# Altium integrated library esd_library.IntLib: 970 symbols (part 3 of 6)
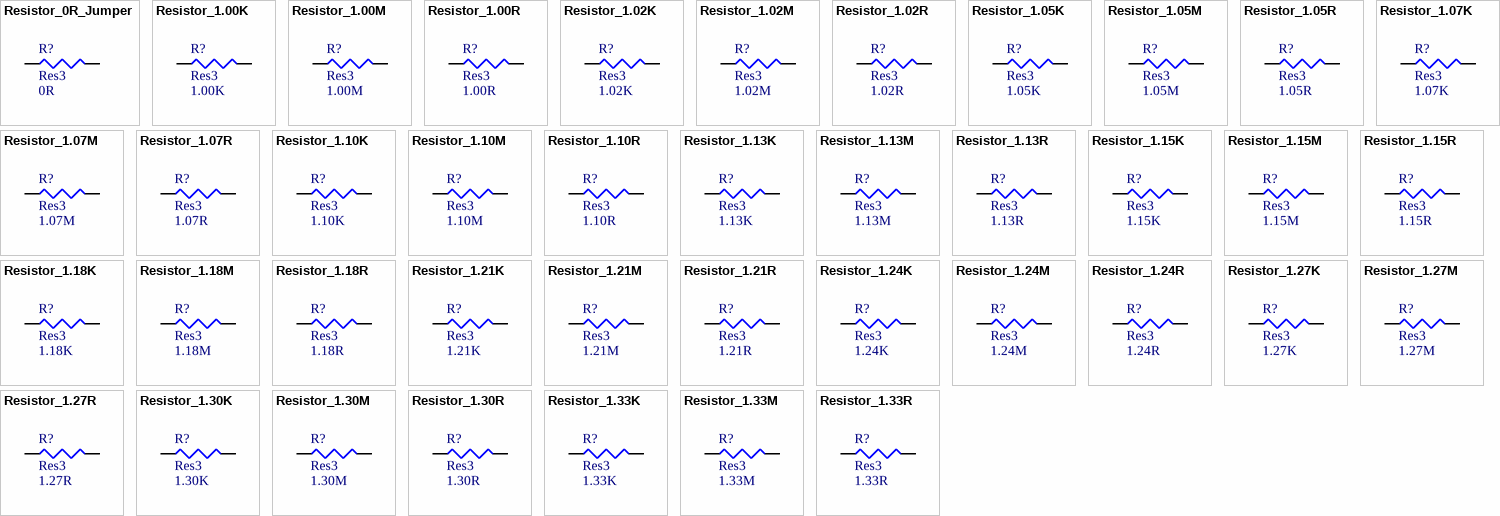
[diagram p28: symbols Resistor_0R_Jumper to Resistor_1.33R]

## Resistor_1.30K
designator R?, comment Res3  value 1.30K
RES SMD 1.30K OHM 1% 1/8W 0805; MPN: CRCW08051K30FKEA; Name: Resistor_1.30K; PN: 541-1.30KCCT-ND; URL: http://www.digikey.ca/product-detail/en/CRCW08051K30FKEA/541-1.30KCCT-ND
footprint RESC2112X05M (Chip Resistor, 2-Leads, Body 2.05x1.25mm, IPC Low Density)
pins: 1, 2

## Resistor_1.30M
designator R?, comment Res3  value 1.30M
RES SMD 1.30M OHM 1% 1/8W 0805; MPN: CRCW08051M30FKEA; Name: Resistor_1.30M; PN: 541-1.30MCCT-ND; URL: http://www.digikey.ca/product-detail/en/CRCW08051M30FKEA/541-1.30MCCT-ND
footprint RESC2112X05M (Chip Resistor, 2-Leads, Body 2.05x1.25mm, IPC Low Density)
pins: 1, 2

## Resistor_1.30R
designator R?, comment Res3  value 1.30R
RES SMD 1.30R OHM 1% 1/8W 0805; MPN: CRCW08051R30FKEA; Name: Resistor_1.30R; PN: 541-1.30CCCT-ND; URL: http://www.digikey.ca/product-detail/en/CRCW08051R30FKEA/541-1.30CCCT-ND
footprint RESC2112X05M (Chip Resistor, 2-Leads, Body 2.05x1.25mm, IPC Low Density)
pins: 1, 2

## Resistor_1.33K
designator R?, comment Res3  value 1.33K
RES SMD 1.33K OHM 1% 1/8W 0805; MPN: CRCW08051K33FKEA; Name: Resistor_1.33K; PN: 541-1.33KCCT-ND; URL: http://www.digikey.ca/product-detail/en/CRCW08051K33FKEA/541-1.33KCCT-ND
footprint RESC2112X05M (Chip Resistor, 2-Leads, Body 2.05x1.25mm, IPC Low Density)
pins: 1, 2

## Resistor_1.33M
designator R?, comment Res3  value 1.33M
RES SMD 1.33M OHM 1% 1/8W 0805; MPN: CRCW08051M33FKEA; Name: Resistor_1.33M; PN: 541-1.33MCCT-ND; URL: http://www.digikey.ca/product-detail/en/CRCW08051M33FKEA/541-1.33MCCT-ND
footprint RESC2112X05M (Chip Resistor, 2-Leads, Body 2.05x1.25mm, IPC Low Density)
pins: 1, 2

## Resistor_1.33R
designator R?, comment Res3  value 1.33R
RES SMD 1.33R OHM 1% 1/8W 0805; MPN: CRCW08051R33FKEA; Name: Resistor_1.33R; PN: 541-1.33CCCT-ND; URL: http://www.digikey.ca/product-detail/en/CRCW08051R33FKEA/541-1.33CCCT-ND
footprint RESC2112X05M (Chip Resistor, 2-Leads, Body 2.05x1.25mm, IPC Low Density)
pins: 1, 2

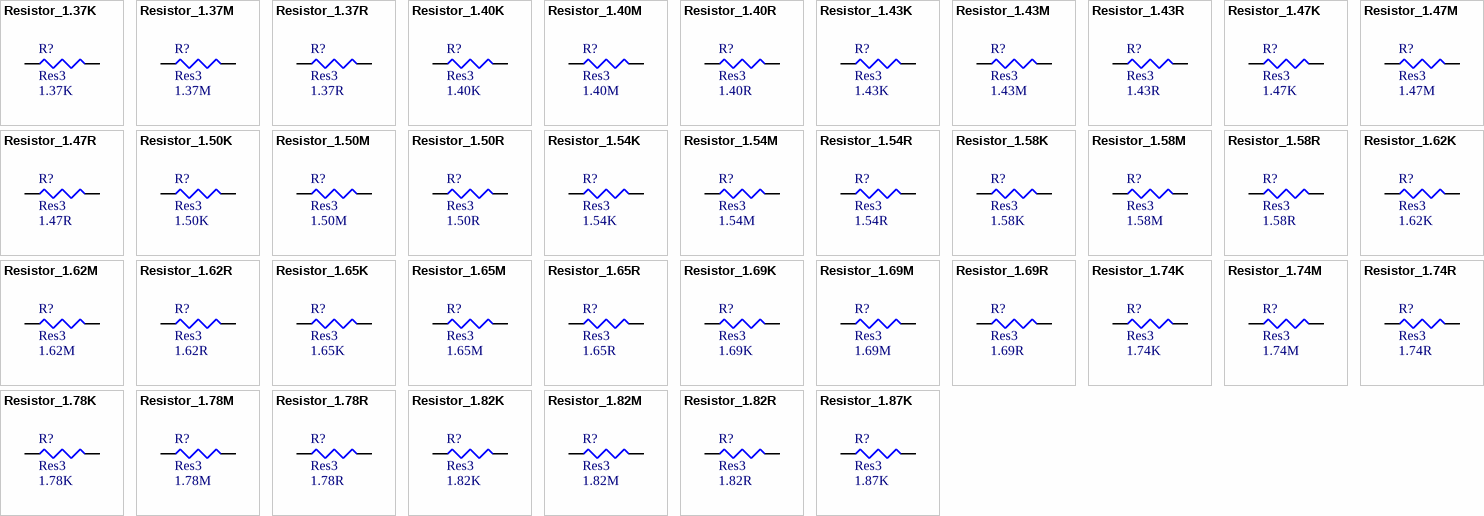
[diagram p11: symbols Resistor_1.37K to Resistor_1.87K]

## Resistor_1.37K
designator R?, comment Res3  value 1.37K
RES SMD 1.37K OHM 1% 1/8W 0805; MPN: CRCW08051K37FKEA; Name: Resistor_1.37K; PN: 541-1.37KCCT-ND; URL: http://www.digikey.ca/product-detail/en/CRCW08051K37FKEA/541-1.37KCCT-ND
footprint RESC2112X05M (Chip Resistor, 2-Leads, Body 2.05x1.25mm, IPC Low Density)
pins: 1, 2

## Resistor_1.37M
designator R?, comment Res3  value 1.37M
RES SMD 1.37M OHM 1% 1/8W 0805; MPN: CRCW08051M37FKEA; Name: Resistor_1.37M; PN: 541-1.37MCCT-ND; URL: http://www.digikey.ca/product-detail/en/CRCW08051M37FKEA/541-1.37MCCT-ND
footprint RESC2112X05M (Chip Resistor, 2-Leads, Body 2.05x1.25mm, IPC Low Density)
pins: 1, 2

## Resistor_1.37R
designator R?, comment Res3  value 1.37R
RES SMD 1.37R OHM 1% 1/8W 0805; MPN: CRCW08051R37FKEA; Name: Resistor_1.37R; PN: 541-1.37CCCT-ND; URL: http://www.digikey.ca/product-detail/en/CRCW08051R37FKEA/541-1.37CCCT-ND
footprint RESC2112X05M (Chip Resistor, 2-Leads, Body 2.05x1.25mm, IPC Low Density)
pins: 1, 2

## Resistor_1.40K
designator R?, comment Res3  value 1.40K
RES SMD 1.40K OHM 1% 1/8W 0805; MPN: CRCW08051K40FKEA; Name: Resistor_1.40K; PN: 541-1.40KCCT-ND; URL: http://www.digikey.ca/product-detail/en/CRCW08051K40FKEA/541-1.40KCCT-ND
footprint RESC2112X05M (Chip Resistor, 2-Leads, Body 2.05x1.25mm, IPC Low Density)
pins: 1, 2

## Resistor_1.40M
designator R?, comment Res3  value 1.40M
RES SMD 1.40M OHM 1% 1/8W 0805; MPN: CRCW08051M40FKEA; Name: Resistor_1.40M; PN: 541-1.40MCCT-ND; URL: http://www.digikey.ca/product-detail/en/CRCW08051M40FKEA/541-1.40MCCT-ND
footprint RESC2112X05M (Chip Resistor, 2-Leads, Body 2.05x1.25mm, IPC Low Density)
pins: 1, 2

## Resistor_1.40R
designator R?, comment Res3  value 1.40R
RES SMD 1.40R OHM 1% 1/8W 0805; MPN: CRCW08051R40FKEA; Name: Resistor_1.40R; PN: 541-1.40CCCT-ND; URL: http://www.digikey.ca/product-detail/en/CRCW08051R40FKEA/541-1.40CCCT-ND
footprint RESC2112X05M (Chip Resistor, 2-Leads, Body 2.05x1.25mm, IPC Low Density)
pins: 1, 2

## Resistor_1.43K
designator R?, comment Res3  value 1.43K
RES SMD 1.43K OHM 1% 1/8W 0805; MPN: CRCW08051K43FKEA; Name: Resistor_1.43K; PN: 541-1.43KCCT-ND; URL: http://www.digikey.ca/product-detail/en/CRCW08051K43FKEA/541-1.43KCCT-ND
footprint RESC2112X05M (Chip Resistor, 2-Leads, Body 2.05x1.25mm, IPC Low Density)
pins: 1, 2

## Resistor_1.43M
designator R?, comment Res3  value 1.43M
RES SMD 1.43M OHM 1% 1/8W 0805; MPN: CRCW08051M43FKEA; Name: Resistor_1.43M; PN: 541-1.43MCCT-ND; URL: http://www.digikey.ca/product-detail/en/CRCW08051M43FKEA/541-1.43MCCT-ND
footprint RESC2112X05M (Chip Resistor, 2-Leads, Body 2.05x1.25mm, IPC Low Density)
pins: 1, 2

## Resistor_1.43R
designator R?, comment Res3  value 1.43R
RES SMD 1.43R OHM 1% 1/8W 0805; MPN: CRCW08051R43FKEA; Name: Resistor_1.43R; PN: 541-1.43CCCT-ND; URL: http://www.digikey.ca/product-detail/en/CRCW08051R43FKEA/541-1.43CCCT-ND
footprint RESC2112X05M (Chip Resistor, 2-Leads, Body 2.05x1.25mm, IPC Low Density)
pins: 1, 2

## Resistor_1.47K
designator R?, comment Res3  value 1.47K
RES SMD 1.47K OHM 1% 1/8W 0805; MPN: CRCW08051K47FKEA; Name: Resistor_1.47K; PN: 541-1.47KCCT-ND; URL: http://www.digikey.ca/product-detail/en/CRCW08051K47FKEA/541-1.47KCCT-ND
footprint RESC2112X05M (Chip Resistor, 2-Leads, Body 2.05x1.25mm, IPC Low Density)
pins: 1, 2

## Resistor_1.47M
designator R?, comment Res3  value 1.47M
RES SMD 1.47M OHM 1% 1/8W 0805; MPN: CRCW08051M47FKEA; Name: Resistor_1.47M; PN: 541-1.47MCCT-ND; URL: http://www.digikey.ca/product-detail/en/CRCW08051M47FKEA/541-1.47MCCT-ND
footprint RESC2112X05M (Chip Resistor, 2-Leads, Body 2.05x1.25mm, IPC Low Density)
pins: 1, 2

## Resistor_1.47R
designator R?, comment Res3  value 1.47R
RES SMD 1.47R OHM 1% 1/8W 0805; MPN: CRCW08051R47FKEA; Name: Resistor_1.47R; PN: 541-1.47CCCT-ND; URL: http://www.digikey.ca/product-detail/en/CRCW08051R47FKEA/541-1.47CCCT-ND
footprint RESC2112X05M (Chip Resistor, 2-Leads, Body 2.05x1.25mm, IPC Low Density)
pins: 1, 2

## Resistor_1.50K
designator R?, comment Res3  value 1.50K
RES SMD 1.50K OHM 1% 1/8W 0805; MPN: CRCW08051K50FKEA; Name: Resistor_1.50K; PN: 541-1.50KCCT-ND; URL: http://www.digikey.ca/product-detail/en/CRCW08051K50FKEA/541-1.50KCCT-ND
footprint RESC2112X05M (Chip Resistor, 2-Leads, Body 2.05x1.25mm, IPC Low Density)
pins: 1, 2

## Resistor_1.50M
designator R?, comment Res3  value 1.50M
RES SMD 1.50M OHM 1% 1/8W 0805; MPN: CRCW08051M50FKEA; Name: Resistor_1.50M; PN: 541-1.50MCCT-ND; URL: http://www.digikey.ca/product-detail/en/CRCW08051M50FKEA/541-1.50MCCT-ND
footprint RESC2112X05M (Chip Resistor, 2-Leads, Body 2.05x1.25mm, IPC Low Density)
pins: 1, 2

## Resistor_1.50R
designator R?, comment Res3  value 1.50R
RES SMD 1.50R OHM 1% 1/8W 0805; MPN: CRCW08051R50FKEA; Name: Resistor_1.50R; PN: 541-1.50CCCT-ND; URL: http://www.digikey.ca/product-detail/en/CRCW08051R50FKEA/541-1.50CCCT-ND
footprint RESC2112X05M (Chip Resistor, 2-Leads, Body 2.05x1.25mm, IPC Low Density)
pins: 1, 2

## Resistor_1.54K
designator R?, comment Res3  value 1.54K
RES SMD 1.54K OHM 1% 1/8W 0805; MPN: CRCW08051K54FKEA; Name: Resistor_1.54K; PN: 541-1.54KCCT-ND; URL: http://www.digikey.ca/product-detail/en/CRCW08051K54FKEA/541-1.54KCCT-ND
footprint RESC2112X05M (Chip Resistor, 2-Leads, Body 2.05x1.25mm, IPC Low Density)
pins: 1, 2

## Resistor_1.54M
designator R?, comment Res3  value 1.54M
RES SMD 1.54M OHM 1% 1/8W 0805; MPN: CRCW08051M54FKEA; Name: Resistor_1.54M; PN: 541-1.54MCCT-ND; URL: http://www.digikey.ca/product-detail/en/CRCW08051M54FKEA/541-1.54MCCT-ND
footprint RESC2112X05M (Chip Resistor, 2-Leads, Body 2.05x1.25mm, IPC Low Density)
pins: 1, 2

## Resistor_1.54R
designator R?, comment Res3  value 1.54R
RES SMD 1.54R OHM 1% 1/8W 0805; MPN: CRCW08051R54FKEA; Name: Resistor_1.54R; PN: 541-1.54CCCT-ND; URL: http://www.digikey.ca/product-detail/en/CRCW08051R54FKEA/541-1.54CCCT-ND
footprint RESC2112X05M (Chip Resistor, 2-Leads, Body 2.05x1.25mm, IPC Low Density)
pins: 1, 2

## Resistor_1.58K
designator R?, comment Res3  value 1.58K
RES SMD 1.58K OHM 1% 1/8W 0805; MPN: CRCW08051K58FKEA; Name: Resistor_1.58K; PN: 541-1.58KCCT-ND; URL: http://www.digikey.ca/product-detail/en/CRCW08051K58FKEA/541-1.58KCCT-ND
footprint RESC2112X05M (Chip Resistor, 2-Leads, Body 2.05x1.25mm, IPC Low Density)
pins: 1, 2

## Resistor_1.58M
designator R?, comment Res3  value 1.58M
RES SMD 1.58M OHM 1% 1/8W 0805; MPN: CRCW08051M58FKEA; Name: Resistor_1.58M; PN: 541-1.58MCCT-ND; URL: http://www.digikey.ca/product-detail/en/CRCW08051M58FKEA/541-1.58MCCT-ND
footprint RESC2112X05M (Chip Resistor, 2-Leads, Body 2.05x1.25mm, IPC Low Density)
pins: 1, 2

## Resistor_1.58R
designator R?, comment Res3  value 1.58R
RES SMD 1.58R OHM 1% 1/8W 0805; MPN: CRCW08051R58FKEA; Name: Resistor_1.58R; PN: 541-1.58CCCT-ND; URL: http://www.digikey.ca/product-detail/en/CRCW08051R58FKEA/541-1.58CCCT-ND
footprint RESC2112X05M (Chip Resistor, 2-Leads, Body 2.05x1.25mm, IPC Low Density)
pins: 1, 2

## Resistor_1.62K
designator R?, comment Res3  value 1.62K
RES SMD 1.62K OHM 1% 1/8W 0805; MPN: CRCW08051K62FKEA; Name: Resistor_1.62K; PN: 541-1.62KCCT-ND; URL: http://www.digikey.ca/product-detail/en/CRCW08051K62FKEA/541-1.62KCCT-ND
footprint RESC2112X05M (Chip Resistor, 2-Leads, Body 2.05x1.25mm, IPC Low Density)
pins: 1, 2

## Resistor_1.62M
designator R?, comment Res3  value 1.62M
RES SMD 1.62M OHM 1% 1/8W 0805; MPN: CRCW08051M62FKEA; Name: Resistor_1.62M; PN: 541-1.62MCCT-ND; URL: http://www.digikey.ca/product-detail/en/CRCW08051M62FKEA/541-1.62MCCT-ND
footprint RESC2112X05M (Chip Resistor, 2-Leads, Body 2.05x1.25mm, IPC Low Density)
pins: 1, 2

## Resistor_1.62R
designator R?, comment Res3  value 1.62R
RES SMD 1.62R OHM 1% 1/8W 0805; MPN: CRCW08051R62FKEA; Name: Resistor_1.62R; PN: 541-1.62CCCT-ND; URL: http://www.digikey.ca/product-detail/en/CRCW08051R62FKEA/541-1.62CCCT-ND
footprint RESC2112X05M (Chip Resistor, 2-Leads, Body 2.05x1.25mm, IPC Low Density)
pins: 1, 2

## Resistor_1.65K
designator R?, comment Res3  value 1.65K
RES SMD 1.65K OHM 1% 1/8W 0805; MPN: CRCW08051K65FKEA; Name: Resistor_1.65K; PN: 541-1.65KCCT-ND; URL: http://www.digikey.ca/product-detail/en/CRCW08051K65FKEA/541-1.65KCCT-ND
footprint RESC2112X05M (Chip Resistor, 2-Leads, Body 2.05x1.25mm, IPC Low Density)
pins: 1, 2

## Resistor_1.65M
designator R?, comment Res3  value 1.65M
RES SMD 1.65M OHM 1% 1/8W 0805; MPN: CRCW08051M65FKEA; Name: Resistor_1.65M; PN: 541-1.65MCCT-ND; URL: http://www.digikey.ca/product-detail/en/CRCW08051M65FKEA/541-1.65MCCT-ND
footprint RESC2112X05M (Chip Resistor, 2-Leads, Body 2.05x1.25mm, IPC Low Density)
pins: 1, 2

## Resistor_1.65R
designator R?, comment Res3  value 1.65R
RES SMD 1.65R OHM 1% 1/8W 0805; MPN: CRCW08051R65FKEA; Name: Resistor_1.65R; PN: 541-1.65CCCT-ND; URL: http://www.digikey.ca/product-detail/en/CRCW08051R65FKEA/541-1.65CCCT-ND
footprint RESC2112X05M (Chip Resistor, 2-Leads, Body 2.05x1.25mm, IPC Low Density)
pins: 1, 2

## Resistor_1.69K
designator R?, comment Res3  value 1.69K
RES SMD 1.69K OHM 1% 1/8W 0805; MPN: CRCW08051K69FKEA; Name: Resistor_1.69K; PN: 541-1.69KCCT-ND; URL: http://www.digikey.ca/product-detail/en/CRCW08051K69FKEA/541-1.69KCCT-ND
footprint RESC2112X05M (Chip Resistor, 2-Leads, Body 2.05x1.25mm, IPC Low Density)
pins: 1, 2

## Resistor_1.69M
designator R?, comment Res3  value 1.69M
RES SMD 1.69M OHM 1% 1/8W 0805; MPN: CRCW08051M69FKEA; Name: Resistor_1.69M; PN: 541-1.69MCCT-ND; URL: http://www.digikey.ca/product-detail/en/CRCW08051M69FKEA/541-1.69MCCT-ND
footprint RESC2112X05M (Chip Resistor, 2-Leads, Body 2.05x1.25mm, IPC Low Density)
pins: 1, 2

## Resistor_1.69R
designator R?, comment Res3  value 1.69R
RES SMD 1.69R OHM 1% 1/8W 0805; MPN: CRCW08051R69FKEA; Name: Resistor_1.69R; PN: 541-1.69CCCT-ND; URL: http://www.digikey.ca/product-detail/en/CRCW08051R69FKEA/541-1.69CCCT-ND
footprint RESC2112X05M (Chip Resistor, 2-Leads, Body 2.05x1.25mm, IPC Low Density)
pins: 1, 2

## Resistor_1.74K
designator R?, comment Res3  value 1.74K
RES SMD 1.74K OHM 1% 1/8W 0805; MPN: CRCW08051K74FKEA; Name: Resistor_1.74K; PN: 541-1.74KCCT-ND; URL: http://www.digikey.ca/product-detail/en/CRCW08051K74FKEA/541-1.74KCCT-ND
footprint RESC2112X05M (Chip Resistor, 2-Leads, Body 2.05x1.25mm, IPC Low Density)
pins: 1, 2

## Resistor_1.74M
designator R?, comment Res3  value 1.74M
RES SMD 1.74M OHM 1% 1/8W 0805; MPN: CRCW08051M74FKEA; Name: Resistor_1.74M; PN: 541-1.74MCCT-ND; URL: http://www.digikey.ca/product-detail/en/CRCW08051M74FKEA/541-1.74MCCT-ND
footprint RESC2112X05M (Chip Resistor, 2-Leads, Body 2.05x1.25mm, IPC Low Density)
pins: 1, 2

## Resistor_1.74R
designator R?, comment Res3  value 1.74R
RES SMD 1.74R OHM 1% 1/8W 0805; MPN: CRCW08051R74FKEA; Name: Resistor_1.74R; PN: 541-1.74CCCT-ND; URL: http://www.digikey.ca/product-detail/en/CRCW08051R74FKEA/541-1.74CCCT-ND
footprint RESC2112X05M (Chip Resistor, 2-Leads, Body 2.05x1.25mm, IPC Low Density)
pins: 1, 2

## Resistor_1.78K
designator R?, comment Res3  value 1.78K
RES SMD 1.78K OHM 1% 1/8W 0805; MPN: CRCW08051K78FKEA; Name: Resistor_1.78K; PN: 541-1.78KCCT-ND; URL: http://www.digikey.ca/product-detail/en/CRCW08051K78FKEA/541-1.78KCCT-ND
footprint RESC2112X05M (Chip Resistor, 2-Leads, Body 2.05x1.25mm, IPC Low Density)
pins: 1, 2

## Resistor_1.78M
designator R?, comment Res3  value 1.78M
RES SMD 1.78M OHM 1% 1/8W 0805; MPN: CRCW08051M78FKEA; Name: Resistor_1.78M; PN: 541-1.78MCCT-ND; URL: http://www.digikey.ca/product-detail/en/CRCW08051M78FKEA/541-1.78MCCT-ND
footprint RESC2112X05M (Chip Resistor, 2-Leads, Body 2.05x1.25mm, IPC Low Density)
pins: 1, 2

## Resistor_1.78R
designator R?, comment Res3  value 1.78R
RES SMD 1.78R OHM 1% 1/8W 0805; MPN: CRCW08051R78FKEA; Name: Resistor_1.78R; PN: 541-1.78CCCT-ND; URL: http://www.digikey.ca/product-detail/en/CRCW08051R78FKEA/541-1.78CCCT-ND
footprint RESC2112X05M (Chip Resistor, 2-Leads, Body 2.05x1.25mm, IPC Low Density)
pins: 1, 2

## Resistor_1.82K
designator R?, comment Res3  value 1.82K
RES SMD 1.82K OHM 1% 1/8W 0805; MPN: CRCW08051K82FKEA; Name: Resistor_1.82K; PN: 541-1.82KCCT-ND; URL: http://www.digikey.ca/product-detail/en/CRCW08051K82FKEA/541-1.82KCCT-ND
footprint RESC2112X05M (Chip Resistor, 2-Leads, Body 2.05x1.25mm, IPC Low Density)
pins: 1, 2

## Resistor_1.82M
designator R?, comment Res3  value 1.82M
RES SMD 1.82M OHM 1% 1/8W 0805; MPN: CRCW08051M82FKEA; Name: Resistor_1.82M; PN: 541-1.82MCCT-ND; URL: http://www.digikey.ca/product-detail/en/CRCW08051M82FKEA/541-1.82MCCT-ND
footprint RESC2112X05M (Chip Resistor, 2-Leads, Body 2.05x1.25mm, IPC Low Density)
pins: 1, 2

## Resistor_1.82R
designator R?, comment Res3  value 1.82R
RES SMD 1.82R OHM 1% 1/8W 0805; MPN: CRCW08051R82FKEA; Name: Resistor_1.82R; PN: 541-1.82CCCT-ND; URL: http://www.digikey.ca/product-detail/en/CRCW08051R82FKEA/541-1.82CCCT-ND
footprint RESC2112X05M (Chip Resistor, 2-Leads, Body 2.05x1.25mm, IPC Low Density)
pins: 1, 2

## Resistor_1.87K
designator R?, comment Res3  value 1.87K
RES SMD 1.87K OHM 1% 1/8W 0805; MPN: CRCW08051K87FKEA; Name: Resistor_1.87K; PN: 541-1.87KCCT-ND; URL: http://www.digikey.ca/product-detail/en/CRCW08051K87FKEA/541-1.87KCCT-ND
footprint RESC2112X05M (Chip Resistor, 2-Leads, Body 2.05x1.25mm, IPC Low Density)
pins: 1, 2

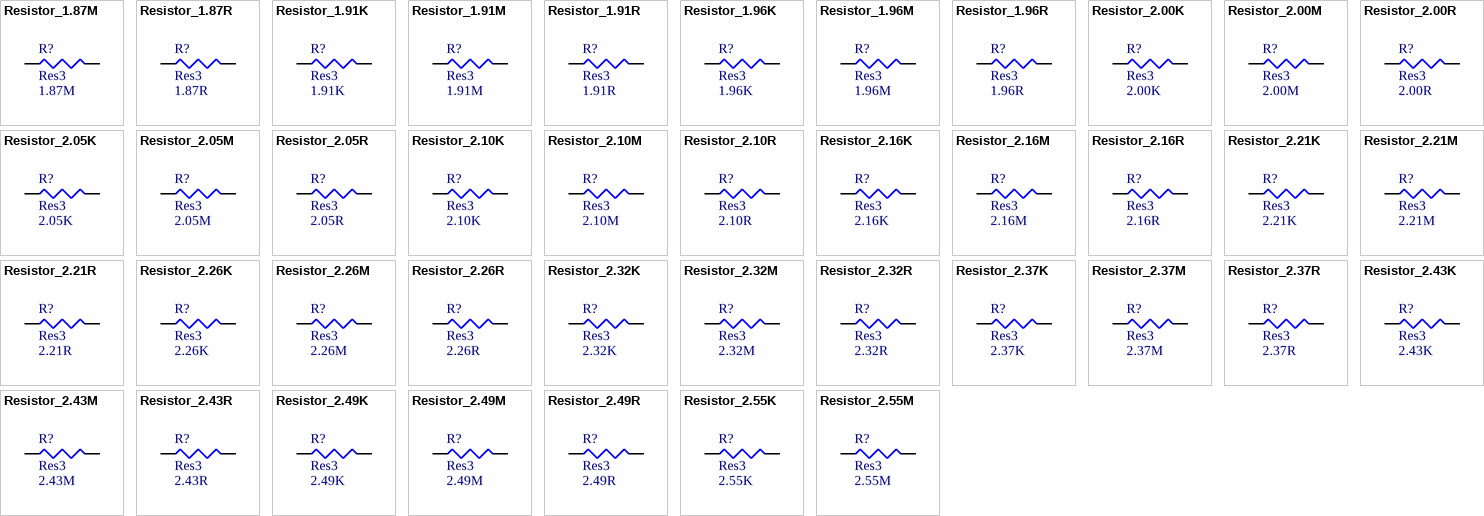
[diagram p12: symbols Resistor_1.87M to Resistor_2.55M]

## Resistor_1.87M
designator R?, comment Res3  value 1.87M
RES SMD 1.87M OHM 1% 1/8W 0805; MPN: CRCW08051M87FKEA; Name: Resistor_1.87M; PN: 541-1.87MCCT-ND; URL: http://www.digikey.ca/product-detail/en/CRCW08051M87FKEA/541-1.87MCCT-ND
footprint RESC2112X05M (Chip Resistor, 2-Leads, Body 2.05x1.25mm, IPC Low Density)
pins: 1, 2

## Resistor_1.87R
designator R?, comment Res3  value 1.87R
RES SMD 1.87R OHM 1% 1/8W 0805; MPN: CRCW08051R87FKEA; Name: Resistor_1.87R; PN: 541-1.87CCCT-ND; URL: http://www.digikey.ca/product-detail/en/CRCW08051R87FKEA/541-1.87CCCT-ND
footprint RESC2112X05M (Chip Resistor, 2-Leads, Body 2.05x1.25mm, IPC Low Density)
pins: 1, 2

## Resistor_1.91K
designator R?, comment Res3  value 1.91K
RES SMD 1.91K OHM 1% 1/8W 0805; MPN: CRCW08051K91FKEA; Name: Resistor_1.91K; PN: 541-1.91KCCT-ND; URL: http://www.digikey.ca/product-detail/en/CRCW08051K91FKEA/541-1.91KCCT-ND
footprint RESC2112X05M (Chip Resistor, 2-Leads, Body 2.05x1.25mm, IPC Low Density)
pins: 1, 2

## Resistor_1.91M
designator R?, comment Res3  value 1.91M
RES SMD 1.91M OHM 1% 1/8W 0805; MPN: CRCW08051M91FKEA; Name: Resistor_1.91M; PN: 541-1.91MCCT-ND; URL: http://www.digikey.ca/product-detail/en/CRCW08051M91FKEA/541-1.91MCCT-ND
footprint RESC2112X05M (Chip Resistor, 2-Leads, Body 2.05x1.25mm, IPC Low Density)
pins: 1, 2

## Resistor_1.91R
designator R?, comment Res3  value 1.91R
RES SMD 1.91R OHM 1% 1/8W 0805; MPN: CRCW08051R91FKEA; Name: Resistor_1.91R; PN: 541-1.91CCCT-ND; URL: http://www.digikey.ca/product-detail/en/CRCW08051R91FKEA/541-1.91CCCT-ND
footprint RESC2112X05M (Chip Resistor, 2-Leads, Body 2.05x1.25mm, IPC Low Density)
pins: 1, 2

## Resistor_1.96K
designator R?, comment Res3  value 1.96K
RES SMD 1.96K OHM 1% 1/8W 0805; MPN: CRCW08051K96FKEA; Name: Resistor_1.96K; PN: 541-1.96KCCT-ND; URL: http://www.digikey.ca/product-detail/en/CRCW08051K96FKEA/541-1.96KCCT-ND
footprint RESC2112X05M (Chip Resistor, 2-Leads, Body 2.05x1.25mm, IPC Low Density)
pins: 1, 2

## Resistor_1.96M
designator R?, comment Res3  value 1.96M
RES SMD 1.96M OHM 1% 1/8W 0805; MPN: CRCW08051M96FKEA; Name: Resistor_1.96M; PN: 541-1.96MCCT-ND; URL: http://www.digikey.ca/product-detail/en/CRCW08051M96FKEA/541-1.96MCCT-ND
footprint RESC2112X05M (Chip Resistor, 2-Leads, Body 2.05x1.25mm, IPC Low Density)
pins: 1, 2

## Resistor_1.96R
designator R?, comment Res3  value 1.96R
RES SMD 1.96R OHM 1% 1/8W 0805; MPN: CRCW08051R96FKEA; Name: Resistor_1.96R; PN: 541-1.96CCCT-ND; URL: http://www.digikey.ca/product-detail/en/CRCW08051R96FKEA/541-1.96CCCT-ND
footprint RESC2112X05M (Chip Resistor, 2-Leads, Body 2.05x1.25mm, IPC Low Density)
pins: 1, 2

## Resistor_2.00K
designator R?, comment Res3  value 2.00K
RES SMD 2.00K OHM 1% 1/8W 0805; MPN: CRCW08052K00FKEA; Name: Resistor_2.00K; PN: 541-2.00KCCT-ND; URL: http://www.digikey.ca/product-detail/en/CRCW08052K00FKEA/541-2.00KCCT-ND
footprint RESC2112X05M (Chip Resistor, 2-Leads, Body 2.05x1.25mm, IPC Low Density)
pins: 1, 2

## Resistor_2.00M
designator R?, comment Res3  value 2.00M
RES SMD 2.00M OHM 1% 1/8W 0805; MPN: CRCW08052M00FKEA; Name: Resistor_2.00M; PN: 541-2.00MCCT-ND; URL: http://www.digikey.ca/product-detail/en/CRCW08052M00FKEA/541-2.00MCCT-ND
footprint RESC2112X05M (Chip Resistor, 2-Leads, Body 2.05x1.25mm, IPC Low Density)
pins: 1, 2

## Resistor_2.00R
designator R?, comment Res3  value 2.00R
RES SMD 2.00R OHM 1% 1/8W 0805; MPN: CRCW08052R00FKEA; Name: Resistor_2.00R; PN: 541-2.00CCCT-ND; URL: http://www.digikey.ca/product-detail/en/CRCW08052R00FKEA/541-2.00CCCT-ND
footprint RESC2112X05M (Chip Resistor, 2-Leads, Body 2.05x1.25mm, IPC Low Density)
pins: 1, 2

## Resistor_2.05K
designator R?, comment Res3  value 2.05K
RES SMD 2.05K OHM 1% 1/8W 0805; MPN: CRCW08052K05FKEA; Name: Resistor_2.05K; PN: 541-2.05KCCT-ND; URL: http://www.digikey.ca/product-detail/en/CRCW08052K05FKEA/541-2.05KCCT-ND
footprint RESC2112X05M (Chip Resistor, 2-Leads, Body 2.05x1.25mm, IPC Low Density)
pins: 1, 2

## Resistor_2.05M
designator R?, comment Res3  value 2.05M
RES SMD 2.05M OHM 1% 1/8W 0805; MPN: CRCW08052M05FKEA; Name: Resistor_2.05M; PN: 541-2.05MCCT-ND; URL: http://www.digikey.ca/product-detail/en/CRCW08052M05FKEA/541-2.05MCCT-ND
footprint RESC2112X05M (Chip Resistor, 2-Leads, Body 2.05x1.25mm, IPC Low Density)
pins: 1, 2

## Resistor_2.05R
designator R?, comment Res3  value 2.05R
RES SMD 2.05R OHM 1% 1/8W 0805; MPN: CRCW08052R05FKEA; Name: Resistor_2.05R; PN: 541-2.05CCCT-ND; URL: http://www.digikey.ca/product-detail/en/CRCW08052R05FKEA/541-2.05CCCT-ND
footprint RESC2112X05M (Chip Resistor, 2-Leads, Body 2.05x1.25mm, IPC Low Density)
pins: 1, 2

## Resistor_2.10K
designator R?, comment Res3  value 2.10K
RES SMD 2.10K OHM 1% 1/8W 0805; MPN: CRCW08052K10FKEA; Name: Resistor_2.10K; PN: 541-2.10KCCT-ND; URL: http://www.digikey.ca/product-detail/en/CRCW08052K10FKEA/541-2.10KCCT-ND
footprint RESC2112X05M (Chip Resistor, 2-Leads, Body 2.05x1.25mm, IPC Low Density)
pins: 1, 2

## Resistor_2.10M
designator R?, comment Res3  value 2.10M
RES SMD 2.10M OHM 1% 1/8W 0805; MPN: CRCW08052M10FKEA; Name: Resistor_2.10M; PN: 541-2.10MCCT-ND; URL: http://www.digikey.ca/product-detail/en/CRCW08052M10FKEA/541-2.10MCCT-ND
footprint RESC2112X05M (Chip Resistor, 2-Leads, Body 2.05x1.25mm, IPC Low Density)
pins: 1, 2

## Resistor_2.10R
designator R?, comment Res3  value 2.10R
RES SMD 2.10R OHM 1% 1/8W 0805; MPN: CRCW08052R10FKEA; Name: Resistor_2.10R; PN: 541-2.10CCCT-ND; URL: http://www.digikey.ca/product-detail/en/CRCW08052R10FKEA/541-2.10CCCT-ND
footprint RESC2112X05M (Chip Resistor, 2-Leads, Body 2.05x1.25mm, IPC Low Density)
pins: 1, 2

## Resistor_2.16K
designator R?, comment Res3  value 2.16K
RES SMD 2.16K OHM 1% 1/8W 0805; MPN: CRCW08052K16FKEA; Name: Resistor_2.16K; PN: 541-2.16KCCT-ND; URL: http://www.digikey.ca/product-detail/en/CRCW08052K16FKEA/541-2.16KCCT-ND
footprint RESC2112X05M (Chip Resistor, 2-Leads, Body 2.05x1.25mm, IPC Low Density)
pins: 1, 2

## Resistor_2.16M
designator R?, comment Res3  value 2.16M
RES SMD 2.16M OHM 1% 1/8W 0805; MPN: CRCW08052M16FKEA; Name: Resistor_2.16M; PN: 541-2.16MCCT-ND; URL: http://www.digikey.ca/product-detail/en/CRCW08052M16FKEA/541-2.16MCCT-ND
footprint RESC2112X05M (Chip Resistor, 2-Leads, Body 2.05x1.25mm, IPC Low Density)
pins: 1, 2

## Resistor_2.16R
designator R?, comment Res3  value 2.16R
RES SMD 2.16R OHM 1% 1/8W 0805; MPN: CRCW08052R16FKEA; Name: Resistor_2.16R; PN: 541-2.16CCCT-ND; URL: http://www.digikey.ca/product-detail/en/CRCW08052R16FKEA/541-2.16CCCT-ND
footprint RESC2112X05M (Chip Resistor, 2-Leads, Body 2.05x1.25mm, IPC Low Density)
pins: 1, 2

## Resistor_2.21K
designator R?, comment Res3  value 2.21K
RES SMD 2.21K OHM 1% 1/8W 0805; MPN: CRCW08052K21FKEA; Name: Resistor_2.21K; PN: 541-2.21KCCT-ND; URL: http://www.digikey.ca/product-detail/en/CRCW08052K21FKEA/541-2.21KCCT-ND
footprint RESC2112X05M (Chip Resistor, 2-Leads, Body 2.05x1.25mm, IPC Low Density)
pins: 1, 2

## Resistor_2.21M
designator R?, comment Res3  value 2.21M
RES SMD 2.21M OHM 1% 1/8W 0805; MPN: CRCW08052M21FKEA; Name: Resistor_2.21M; PN: 541-2.21MCCT-ND; URL: http://www.digikey.ca/product-detail/en/CRCW08052M21FKEA/541-2.21MCCT-ND
footprint RESC2112X05M (Chip Resistor, 2-Leads, Body 2.05x1.25mm, IPC Low Density)
pins: 1, 2

## Resistor_2.21R
designator R?, comment Res3  value 2.21R
RES SMD 2.21R OHM 1% 1/8W 0805; MPN: CRCW08052R21FKEA; Name: Resistor_2.21R; PN: 541-2.21CCCT-ND; URL: http://www.digikey.ca/product-detail/en/CRCW08052R21FKEA/541-2.21CCCT-ND
footprint RESC2112X05M (Chip Resistor, 2-Leads, Body 2.05x1.25mm, IPC Low Density)
pins: 1, 2

## Resistor_2.26K
designator R?, comment Res3  value 2.26K
RES SMD 2.26K OHM 1% 1/8W 0805; MPN: CRCW08052K26FKEA; Name: Resistor_2.26K; PN: 541-2.26KCCT-ND; URL: http://www.digikey.ca/product-detail/en/CRCW08052K26FKEA/541-2.26KCCT-ND
footprint RESC2112X05M (Chip Resistor, 2-Leads, Body 2.05x1.25mm, IPC Low Density)
pins: 1, 2

## Resistor_2.26M
designator R?, comment Res3  value 2.26M
RES SMD 2.26M OHM 1% 1/8W 0805; MPN: CRCW08052M26FKEA; Name: Resistor_2.26M; PN: 541-2.26MCCT-ND; URL: http://www.digikey.ca/product-detail/en/CRCW08052M26FKEA/541-2.26MCCT-ND
footprint RESC2112X05M (Chip Resistor, 2-Leads, Body 2.05x1.25mm, IPC Low Density)
pins: 1, 2

## Resistor_2.26R
designator R?, comment Res3  value 2.26R
RES SMD 2.26R OHM 1% 1/8W 0805; MPN: CRCW08052R26FKEA; Name: Resistor_2.26R; PN: 541-2.26CCCT-ND; URL: http://www.digikey.ca/product-detail/en/CRCW08052R26FKEA/541-2.26CCCT-ND
footprint RESC2112X05M (Chip Resistor, 2-Leads, Body 2.05x1.25mm, IPC Low Density)
pins: 1, 2

## Resistor_2.32K
designator R?, comment Res3  value 2.32K
RES SMD 2.32K OHM 1% 1/8W 0805; MPN: CRCW08052K32FKEA; Name: Resistor_2.32K; PN: 541-2.32KCCT-ND; URL: http://www.digikey.ca/product-detail/en/CRCW08052K32FKEA/541-2.32KCCT-ND
footprint RESC2112X05M (Chip Resistor, 2-Leads, Body 2.05x1.25mm, IPC Low Density)
pins: 1, 2

## Resistor_2.32M
designator R?, comment Res3  value 2.32M
RES SMD 2.32M OHM 1% 1/8W 0805; MPN: CRCW08052M32FKEA; Name: Resistor_2.32M; PN: 541-2.32MCCT-ND; URL: http://www.digikey.ca/product-detail/en/CRCW08052M32FKEA/541-2.32MCCT-ND
footprint RESC2112X05M (Chip Resistor, 2-Leads, Body 2.05x1.25mm, IPC Low Density)
pins: 1, 2

## Resistor_2.32R
designator R?, comment Res3  value 2.32R
RES SMD 2.32R OHM 1% 1/8W 0805; MPN: CRCW08052R32FKEA; Name: Resistor_2.32R; PN: 541-2.32CCCT-ND; URL: http://www.digikey.ca/product-detail/en/CRCW08052R32FKEA/541-2.32CCCT-ND
footprint RESC2112X05M (Chip Resistor, 2-Leads, Body 2.05x1.25mm, IPC Low Density)
pins: 1, 2

## Resistor_2.37K
designator R?, comment Res3  value 2.37K
RES SMD 2.37K OHM 1% 1/8W 0805; MPN: CRCW08052K37FKEA; Name: Resistor_2.37K; PN: 541-2.37KCCT-ND; URL: http://www.digikey.ca/product-detail/en/CRCW08052K37FKEA/541-2.37KCCT-ND
footprint RESC2112X05M (Chip Resistor, 2-Leads, Body 2.05x1.25mm, IPC Low Density)
pins: 1, 2

## Resistor_2.37M
designator R?, comment Res3  value 2.37M
RES SMD 2.37M OHM 1% 1/8W 0805; MPN: CRCW08052M37FKEA; Name: Resistor_2.37M; PN: 541-2.37MCCT-ND; URL: http://www.digikey.ca/product-detail/en/CRCW08052M37FKEA/541-2.37MCCT-ND
footprint RESC2112X05M (Chip Resistor, 2-Leads, Body 2.05x1.25mm, IPC Low Density)
pins: 1, 2

## Resistor_2.37R
designator R?, comment Res3  value 2.37R
RES SMD 2.37R OHM 1% 1/8W 0805; MPN: CRCW08052R37FKEA; Name: Resistor_2.37R; PN: 541-2.37CCCT-ND; URL: http://www.digikey.ca/product-detail/en/CRCW08052R37FKEA/541-2.37CCCT-ND
footprint RESC2112X05M (Chip Resistor, 2-Leads, Body 2.05x1.25mm, IPC Low Density)
pins: 1, 2

## Resistor_2.43K
designator R?, comment Res3  value 2.43K
RES SMD 2.43K OHM 1% 1/8W 0805; MPN: CRCW08052K43FKEA; Name: Resistor_2.43K; PN: 541-2.43KCCT-ND; URL: http://www.digikey.ca/product-detail/en/CRCW08052K43FKEA/541-2.43KCCT-ND
footprint RESC2112X05M (Chip Resistor, 2-Leads, Body 2.05x1.25mm, IPC Low Density)
pins: 1, 2

## Resistor_2.43M
designator R?, comment Res3  value 2.43M
RES SMD 2.43M OHM 1% 1/8W 0805; MPN: CRCW08052M43FKEA; Name: Resistor_2.43M; PN: 541-2.43MCCT-ND; URL: http://www.digikey.ca/product-detail/en/CRCW08052M43FKEA/541-2.43MCCT-ND
footprint RESC2112X05M (Chip Resistor, 2-Leads, Body 2.05x1.25mm, IPC Low Density)
pins: 1, 2

## Resistor_2.43R
designator R?, comment Res3  value 2.43R
RES SMD 2.43R OHM 1% 1/8W 0805; MPN: CRCW08052R43FKEA; Name: Resistor_2.43R; PN: 541-2.43CCCT-ND; URL: http://www.digikey.ca/product-detail/en/CRCW08052R43FKEA/541-2.43CCCT-ND
footprint RESC2112X05M (Chip Resistor, 2-Leads, Body 2.05x1.25mm, IPC Low Density)
pins: 1, 2

## Resistor_2.49K
designator R?, comment Res3  value 2.49K
RES SMD 2.49K OHM 1% 1/8W 0805; MPN: CRCW08052K49FKEA; Name: Resistor_2.49K; PN: 541-2.49KCCT-ND; URL: http://www.digikey.ca/product-detail/en/CRCW08052K49FKEA/541-2.49KCCT-ND
footprint RESC2112X05M (Chip Resistor, 2-Leads, Body 2.05x1.25mm, IPC Low Density)
pins: 1, 2

## Resistor_2.49M
designator R?, comment Res3  value 2.49M
RES SMD 2.49M OHM 1% 1/8W 0805; MPN: CRCW08052M49FKEA; Name: Resistor_2.49M; PN: 541-2.49MCCT-ND; URL: http://www.digikey.ca/product-detail/en/CRCW08052M49FKEA/541-2.49MCCT-ND
footprint RESC2112X05M (Chip Resistor, 2-Leads, Body 2.05x1.25mm, IPC Low Density)
pins: 1, 2

## Resistor_2.49R
designator R?, comment Res3  value 2.49R
RES SMD 2.49R OHM 1% 1/8W 0805; MPN: CRCW08052R49FKEA; Name: Resistor_2.49R; PN: 541-2.49CCCT-ND; URL: http://www.digikey.ca/product-detail/en/CRCW08052R49FKEA/541-2.49CCCT-ND
footprint RESC2112X05M (Chip Resistor, 2-Leads, Body 2.05x1.25mm, IPC Low Density)
pins: 1, 2

## Resistor_2.55K
designator R?, comment Res3  value 2.55K
RES SMD 2.55K OHM 1% 1/8W 0805; MPN: CRCW08052K55FKEA; Name: Resistor_2.55K; PN: 541-2.55KCCT-ND; URL: http://www.digikey.ca/product-detail/en/CRCW08052K55FKEA/541-2.55KCCT-ND
footprint RESC2112X05M (Chip Resistor, 2-Leads, Body 2.05x1.25mm, IPC Low Density)
pins: 1, 2

## Resistor_2.55M
designator R?, comment Res3  value 2.55M
RES SMD 2.55M OHM 1% 1/8W 0805; MPN: CRCW08052M55FKEA; Name: Resistor_2.55M; PN: 541-2.55MCCT-ND; URL: http://www.digikey.ca/product-detail/en/CRCW08052M55FKEA/541-2.55MCCT-ND
footprint RESC2112X05M (Chip Resistor, 2-Leads, Body 2.05x1.25mm, IPC Low Density)
pins: 1, 2

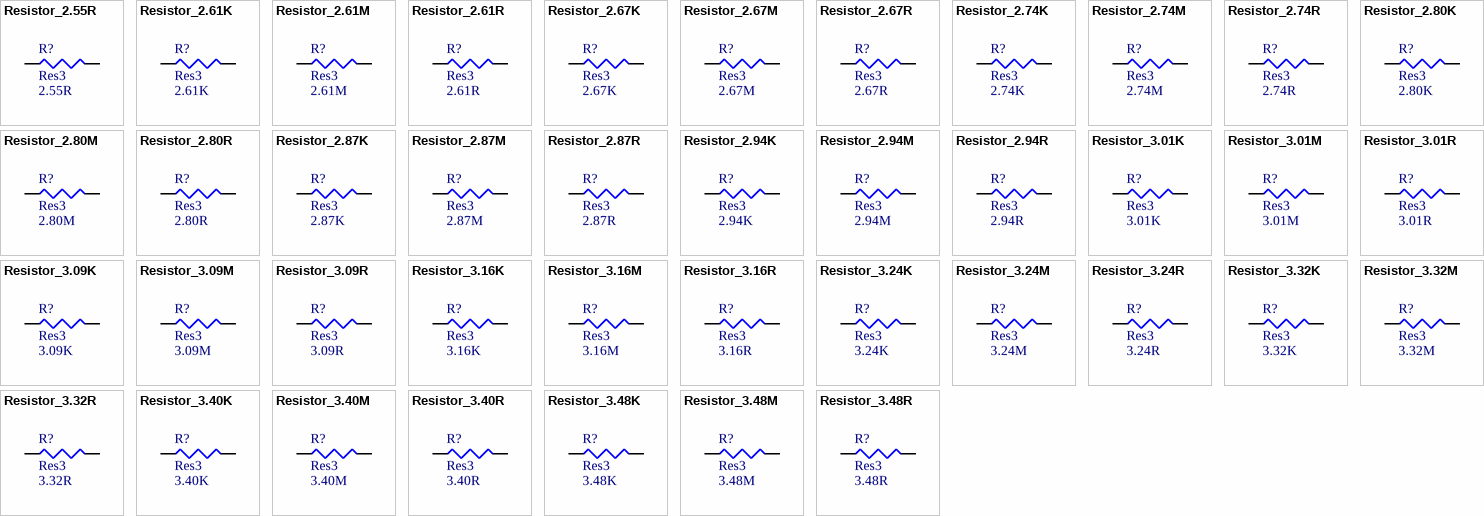
[diagram p13: symbols Resistor_2.55R to Resistor_3.48R]

## Resistor_2.55R
designator R?, comment Res3  value 2.55R
RES SMD 2.55R OHM 1% 1/8W 0805; MPN: CRCW08052R55FKEA; Name: Resistor_2.55R; PN: 541-2.55CCCT-ND; URL: http://www.digikey.ca/product-detail/en/CRCW08052R55FKEA/541-2.55CCCT-ND
footprint RESC2112X05M (Chip Resistor, 2-Leads, Body 2.05x1.25mm, IPC Low Density)
pins: 1, 2

## Resistor_2.61K
designator R?, comment Res3  value 2.61K
RES SMD 2.61K OHM 1% 1/8W 0805; MPN: CRCW08052K61FKEA; Name: Resistor_2.61K; PN: 541-2.61KCCT-ND; URL: http://www.digikey.ca/product-detail/en/CRCW08052K61FKEA/541-2.61KCCT-ND
footprint RESC2112X05M (Chip Resistor, 2-Leads, Body 2.05x1.25mm, IPC Low Density)
pins: 1, 2

## Resistor_2.61M
designator R?, comment Res3  value 2.61M
RES SMD 2.61M OHM 1% 1/8W 0805; MPN: CRCW08052M61FKEA; Name: Resistor_2.61M; PN: 541-2.61MCCT-ND; URL: http://www.digikey.ca/product-detail/en/CRCW08052M61FKEA/541-2.61MCCT-ND
footprint RESC2112X05M (Chip Resistor, 2-Leads, Body 2.05x1.25mm, IPC Low Density)
pins: 1, 2

## Resistor_2.61R
designator R?, comment Res3  value 2.61R
RES SMD 2.61R OHM 1% 1/8W 0805; MPN: CRCW08052R61FKEA; Name: Resistor_2.61R; PN: 541-2.61CCCT-ND; URL: http://www.digikey.ca/product-detail/en/CRCW08052R61FKEA/541-2.61CCCT-ND
footprint RESC2112X05M (Chip Resistor, 2-Leads, Body 2.05x1.25mm, IPC Low Density)
pins: 1, 2

## Resistor_2.67K
designator R?, comment Res3  value 2.67K
RES SMD 2.67K OHM 1% 1/8W 0805; MPN: CRCW08052K67FKEA; Name: Resistor_2.67K; PN: 541-2.67KCCT-ND; URL: http://www.digikey.ca/product-detail/en/CRCW08052K67FKEA/541-2.67KCCT-ND
footprint RESC2112X05M (Chip Resistor, 2-Leads, Body 2.05x1.25mm, IPC Low Density)
pins: 1, 2

## Resistor_2.67M
designator R?, comment Res3  value 2.67M
RES SMD 2.67M OHM 1% 1/8W 0805; MPN: CRCW08052M67FKEA; Name: Resistor_2.67M; PN: 541-2.67MCCT-ND; URL: http://www.digikey.ca/product-detail/en/CRCW08052M67FKEA/541-2.67MCCT-ND
footprint RESC2112X05M (Chip Resistor, 2-Leads, Body 2.05x1.25mm, IPC Low Density)
pins: 1, 2

## Resistor_2.67R
designator R?, comment Res3  value 2.67R